# Altium footprint library Footprints.PcbLib: 50 footprints (part 1 of 4)
Each footprint in its own frame and in the unit in brackets; x right, y up, seen from the top. Pads: shape width x height; smd on the part's side, far side on the other; paste and mask are expansions set on the pad; w line width, h text height; cw(c..) or ccw(c..) is an arc to the next point about the centre after c.
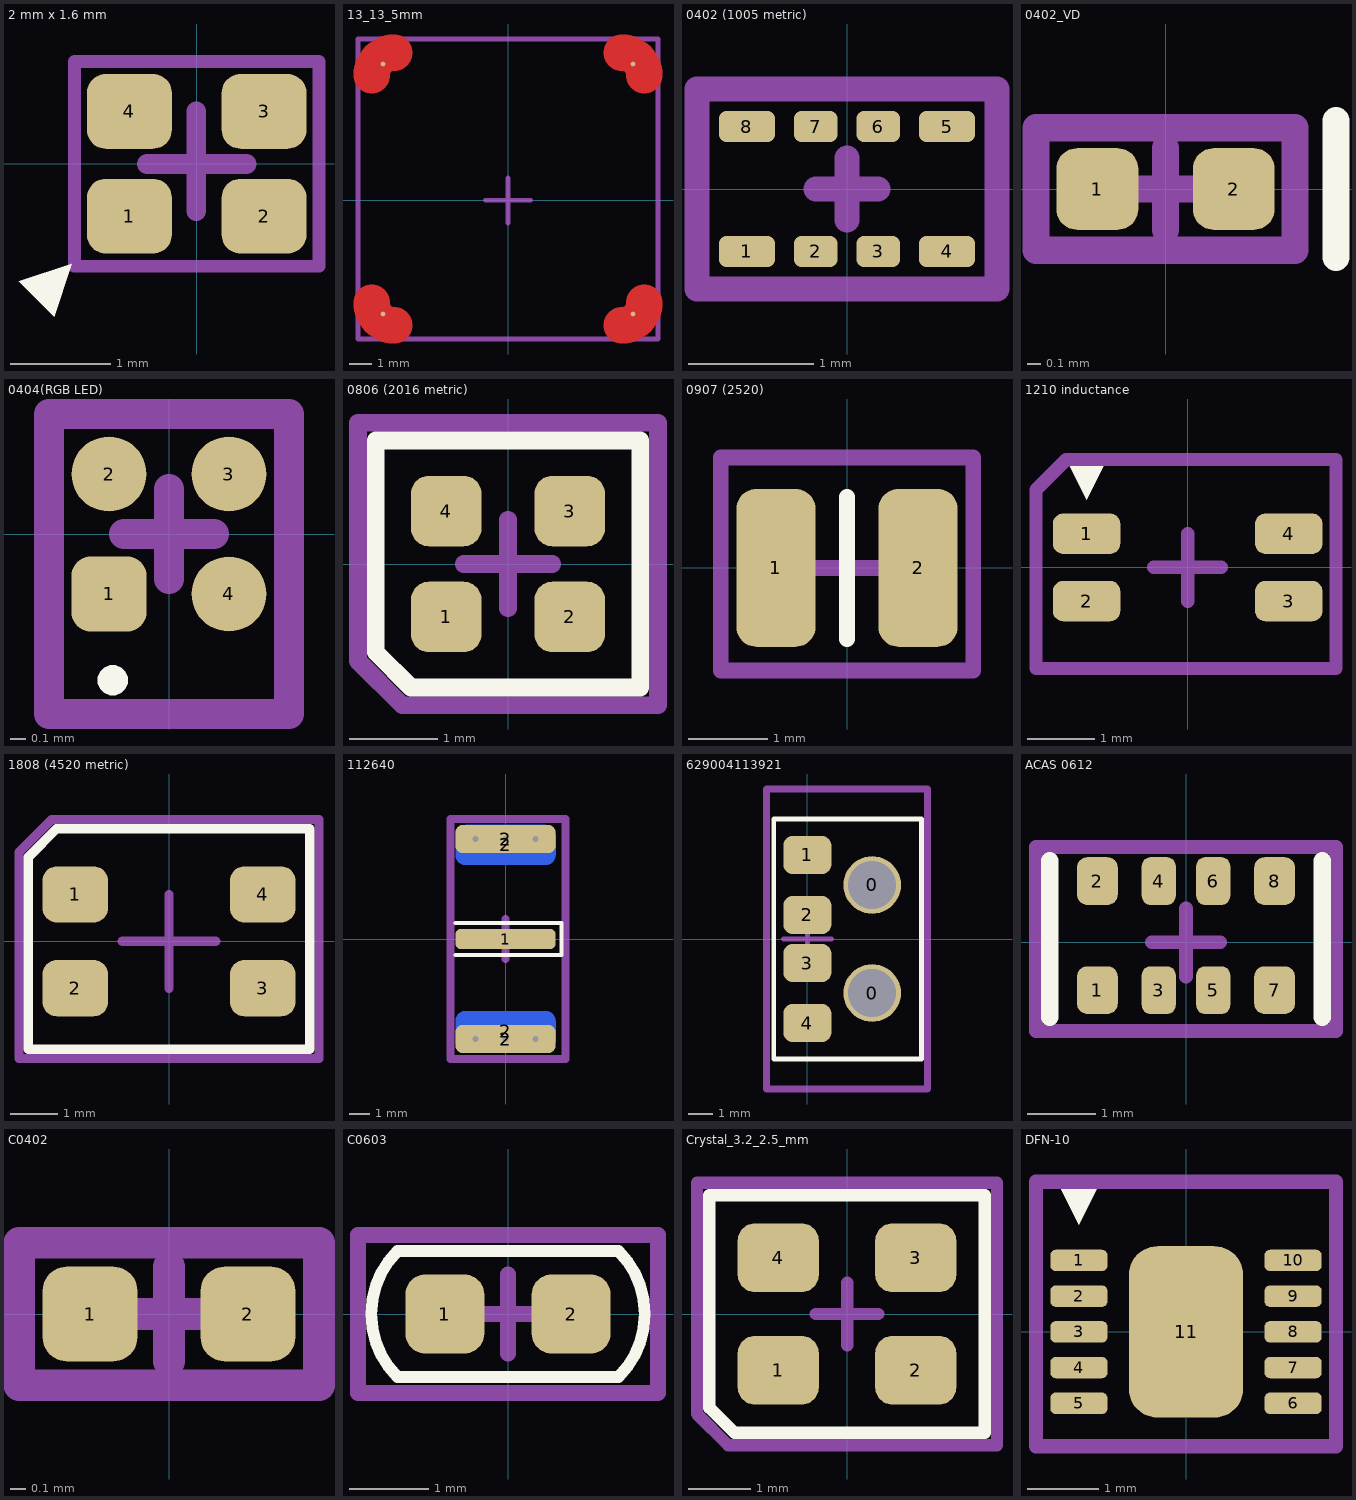
[diagram p0: the footprints below, top view; thin cyan lines are the x and y axes]

## 2 mm x 1.6 mm [mm] "ECS-200-10-37B-CKY-TR"
pads (4):
  rrect50% 0.85x0.75 smd mask+0.051: 1(-0.675,-0.525) 2(0.675,-0.525) 3(0.675,0.525) 4(-0.675,0.525)
Top Overlay:
  region: -1.25,-1 -1.78,-1.177 -1.427,-1.53
Top Assembly:
  lines w0.127: -1.225,-1.025 1.225,-1.025 1.225,1.025 -1.225,1.025 -1.225,-1.025
  lines w0.2: -0.5,0 0.5,0 ; -0.005,-0.475 -0.005,0.525
  text "'.Designator'" at -1.795,1.178 h1
3D body "User Library-NT2016SA-END4910A-48MHZ Crystal (NDK) (1).step": height 0.7, standoff 0, extent -1,-0.8 1,0.8

## 13_13_5mm [mm]
pads (4):
  round 0.2 smd mask+0.051: 1(-5.5,-5) 1(-5.5,6) 1(5.5,-5) 1(5.5,6)
Top Layer:
  lines w1.6: -6,-4.5 ccw(c-5,-4.5) -5,-5.5 ; -6,5.5 cw(c-5,5.5) -5,6.5 ; 5,-5.5 ccw(c5,-4.5) 6,-4.5 ; 5,6.5 cw(c5,5.5) 6,5.5
Top Solder:
  lines w1.6: -6,-4.5 ccw(c-5,-4.5) -5,-5.5 ; -6,5.5 cw(c-5,5.5) -5,6.5 ; 5,-5.5 ccw(c5,-4.5) 6,-4.5 ; 5,6.5 cw(c5,5.5) 6,5.5
Top Assembly:
  lines w0.2: -1,0 1,0 ; 0,-1 0,1 ; -6.6,-6.1 -6.6,7.1 6.6,7.1 6.6,-6.1 -6.6,-6.1
  text "'.Designator'" at -1.795,1.178 h1
3D body "MS130-10S.step": height 5, standoff -1, extent -6.5,-6 6.5,7

## 0402 (1005 metric) [mm] "EXB-28V152JX"
pads (8):
  rrect50% 0.45x0.25 smd mask+0.051: 1(-0.8,-0.5) 4(0.8,-0.5) 5(0.8,0.5) 8(-0.8,0.5)
  rrect50% 0.35x0.25 smd mask+0.051: 2(-0.25,-0.5) 3(0.25,-0.5) 6(0.25,0.5) 7(-0.25,0.5)
Top Assembly:
  lines w0.2: -0.25,0 0.25,0 ; 0,-0.25 0,0.25 ; -1.2,-0.8 1.2,-0.8 1.2,0.8 -1.2,0.8 -1.2,-0.8
  text "'.Designator'" at -1.795,1.178 h1
3D body "User Library-YC124-1.step": height 0.45, standoff 0, extent -1,-0.5 1,0.5

## 0402_VD [mm]
pads (2):
  rrect50% 0.6x0.6 smd mask+0.051: 1(-0.5,0) 2(0.5,0)
Top Overlay:
  lines w0.2: 1.25,-0.5 1.25,0.5
Top Assembly:
  lines w0.2: -0.3,0 0.3,0 ; 0,-0.3 0,0.3 ; -0.95,-0.45 -0.95,0.45 0.95,0.45 0.95,-0.45 -0.95,-0.45
  text "'.Designator'" at -1.795,0.628 h1
3D body "User Library-DIODE_SOD-923.step": height 0.43, standoff 0, extent -0.525,-0.325 0.525,0.325

## 0404(RGB LED) [mm]
pads (4):
  rrect50% 0.5x0.5 smd mask+0.051: 1(-0.4,-0.4)
  round 0.5 smd mask+0.051: 2(-0.4,0.4) 3(0.4,0.4) 4(0.4,-0.4)
Top Overlay:
  region: -0.475,-0.975 -0.475,-0.995 -0.46,-1.032 -0.432,-1.06 -0.395,-1.075 -0.375,-1.075 -0.355,-1.075 -0.318,-1.06 -0.29,-1.032 -0.275,-0.995 -0.275,-0.975 -0.275,-0.955 -0.29,-0.918 -0.318,-0.89 -0.355,-0.875 -0.375,-0.875 -0.395,-0.875 -0.432,-0.89 -0.46,-0.918 -0.475,-0.955
Top Assembly:
  lines w0.2: -0.3,0 0.3,0 ; 0,-0.3 0,0.3 ; -0.8,-1.2 0.8,-1.2 0.8,0.8 -0.8,0.8 -0.8,-1.2
  text "'.Designator'" at -2.4,1.824 h1
3D body "sml-p24muwt86m.stp": height 0.2, standoff 0, extent -0.5,-0.5 0.5,0.5

## 0806 (2016 metric) [mm]
pads (4):
  rrect50% 0.8x0.8 smd mask+0.051: 1(-0.7,-0.6) 2(0.7,-0.6) 3(0.7,0.6) 4(-0.7,0.6)
Top Overlay:
  lines w0.2: -1.5,-1 -1.1,-1.4 1.5,-1.4 1.5,1.4 -1.5,1.4 -1.5,-1
Top Assembly:
  lines w0.2: -0.5,0 0.5,0 ; 0,-0.5 0,0.5 ; -1.7,-1.1 -1.2,-1.6 1.7,-1.6 1.7,1.6 -1.7,1.6 -1.7,-1.1
  text "'.Designator'" at -5.6,2.133 h1
3D body "User Library-NT2016SA-END4910A-48MHZ Crystal (NDK).step": height 0.7, standoff 0, extent -1,-0.8 1,0.8

## 0907 (2520) [mm]
pads (2):
  rrect50% 1x2 smd mask+0.051: 1(-0.9,0) 2(0.9,0)
Top Overlay:
  lines w0.2: 0,-0.9 0,0.9
Top Assembly:
  lines w0.2: -0.5,0 0.5,0 ; 0,-0.5 0,0.5 ; -1.6,-1.3 -1.6,1.4 1.6,1.4 1.6,-1.3 -1.6,-1.3
  text "'.Designator'" at -2.4,1.674 h1
3D body "User Library-Chip Resistor2.step": height 0.63, standoff 0, extent -1.25,-1.25 1.25,1.25

## 1210 inductance [mm]
pads (4):
  rrect50% 1x0.6 smd mask+0.051: 1(-1.5,0.5) 2(-1.5,-0.5) 3(1.5,-0.5) 4(1.5,0.5)
Top Overlay:
  region: -1.5,1 -1.25,1.5 -1.75,1.5
Top Assembly:
  lines w0.2: -0.5,0 0.5,0 ; 0,-0.5 0,0.5 ; -2.25,-1.5 -2.25,1.15 -1.8,1.6 2.2,1.6 2.2,-1.5 -2.25,-1.5
  text "'.Designator'" at -2.4,1.824 h1
3D body "User Library-CM1210B104R-1A.step": height 2.5, standoff 0, extent -1.75,-1.35 1.75,1.35

## 1808 (4520 metric) [mm]
pads (4):
  rrect50% 1.4x1.2 smd mask+0.051: 1(-2,1) 2(-2,-1) 3(2,-1) 4(2,1)
Top Overlay:
  lines w0.2: -3,-2.3 3,-2.3 3,2.4 -2.4,2.4 -3,1.8 -3,-2.3
Top Assembly:
  lines w0.2: -1,0 1,0 ; 0,-1 0,1 ; -3.2,-2.5 3.2,-2.5 3.2,2.6 -2.5,2.6 -3.2,1.9 -3.2,-2.5
  text "'.Designator'" at -2.4,1.574 h1
3D body "acm4520.step": height 1.88, standoff -0.01, extent -2.35,-2.25 2.35,2.25

## 112640 [mm]
pads (5):
  rrect50% 5x1 smd mask+0.051: 1(0,0)
  rrect50% 5x1.4 smd mask+0.051: 2(0,-5) 2(0,5)
  rrect50% 5x2 smd far side mask+0.051: 2(0,-4.6) 2(0,4.7)
via 0,5 diameter 0.6 hole 0.3
via -1.5,5 diameter 0.6 hole 0.3
via 1.5,5 diameter 0.6 hole 0.3
via -1.5,-5 diameter 0.6 hole 0.3
via 1.5,-5 diameter 0.6 hole 0.3
via 0,-5 diameter 0.6 hole 0.3
Top Overlay:
  lines w0.2: -2.5,-0.8 2.8,-0.8 2.8,0.8 -2.5,0.8
Top Assembly:
  lines w0.4: -1,0 1,0 ; 0,-1 0,1 ; -2.75,-6 -2.75,6 3,6 3,-6 -2.75,-6
  text "'.Designator'" at -2.5,1.774 h1
3D body "112640 (1).stp": height 5.9, standoff -5.1, extent -15.485,-5.5 1.485,5.5

## 629004113921 [mm]
pads (6):
  round 2.4 hole 2 mask+0.051: 0(2.7,-2.25) 0(2.7,2.25)
  rrect50% 2x1.6 smd mask+0.051: 1(0,3.5) 2(0,1) 3(0,-1) 4(0,-3.5)
Top Overlay:
  lines w0.2: -1.4,-5 4.75,-5 4.75,5 -1.4,5 -1.4,-5
Top Assembly:
  lines w0.2: -1,0 1,0 ; 0,-1 0,1
  lines w0.3: -1.7,-6.25 -1.7,6.25 5,6.25 5,-6.25 -1.7,-6.25
  text "'.Designator'" at 1.005,-0.022 h1
3D body "Download_STP_629004113921 (rev1).stp": height 2.25, standoff -2.25, extent 0.075,-6 19.875,6

## ACAS 0612 [mm]
pads (8):
  rrect50% 0.6x0.7 smd mask+0.051: 1(-1.3,-0.7) 2(-1.3,0.9) 7(1.3,-0.7) 8(1.3,0.9)
  rrect50% 0.5x0.7 smd mask+0.051: 3(-0.4,-0.7) 4(-0.4,0.9) 5(0.4,-0.7) 6(0.4,0.9)
Top Overlay:
  lines w0.254: -2,-1.1 -2,1.2 ; 2,-1.1 2,1.2
Top Assembly:
  lines w0.2: -0.5,0 0.5,0 ; 0,-0.5 0,0.5 ; -2.2,-1.3 -2.2,1.4 2.2,1.4 2.2,-1.3 -2.2,-1.3
  text "'.Designator'" at -1.795,1.578 h1
3D body "ACAS 0612.stp": height 0.45, standoff 0, extent -1.6,-0.5 1.6,1

## C0402 [mm]
height 0.6
pads (2):
  rrect50% 0.6x0.6 smd mask+0.051: 1(-0.5,0) 2(0.5,0)
Top Assembly:
  lines w0.2: -0.3,0 0.3,0 ; 0,-0.3 0,0.3 ; -0.95,-0.45 -0.95,0.45 0.95,0.45 0.95,-0.45 -0.95,-0.45
  text "'.Designator'" at -1.795,0.628 h1
3D body "User Library-Chip Cap_MLCC_0402 (1005).step": height 0.5, standoff 0, extent -0.5,-0.25 0.5,0.25

## C0603 [mm]
height 0.6
pads (2):
  rrect50% 1x1 smd mask+0.051: 1(-0.8,0) 2(0.8,0)
Top Overlay:
  lines w0.15: -1.4,-0.8 cw(c-0.6,0) -1.4,0.8 1.4,0.8 cw(c0.6,0) 1.4,-0.8 -1.4,-0.8
Top Assembly:
  lines w0.2: -0.5,0 0.5,0 ; 0,-0.5 0,0.5 ; -1.9,-1 1.9,-1 1.9,1 -1.9,1 -1.9,-1
  text "'.Designator'" at -1.645,1.178 h1
3D body "User Library-cap0603.STEP": height 0.86, standoff -0.04, extent -1.3,-0.5 1.3,0.5

## Crystal_3.2_2.5_mm [mm] "for ECS-160-12-33Q-JES-TR"
pads (4):
  rrect50% 1.3x1.1 smd mask+0.051: 1(-1.1,-0.9) 2(1.1,-0.9) 3(1.1,0.9) 4(-1.1,0.9)
Top Overlay:
  lines w0.2: -2.2,-1.5 -2.2,1.9 2.2,1.9 2.2,-1.9 -1.8,-1.9 -2.2,-1.5
Top Assembly:
  lines w0.2: -0.5,0 0.5,0 ; 0,-0.5 0,0.5 ; -2.4,-1.6 -2.4,2.1 2.4,2.1 2.4,-2.1 -1.9,-2.1 -2.4,-1.6
  text "'.Designator'" at -5.8,2.533 h1
3D body "User Library-Crystal_ECX-32.STEP": height 0.82, standoff 0, extent -1.6,-1.25 1.6,1.25

## DFN-10 [mm]
pads (11):
  rrect50% 0.8x0.3 smd mask+0.051: 1(-1.5,1) 2(-1.5,0.5) 3(-1.5,0) 4(-1.5,-0.5) 5(-1.5,-1) 6(1.5,-1) 7(1.5,-0.5) 8(1.5,0) 9(1.5,0.5) 10(1.5,1)
  rrect50% 1.6x2.4 smd mask+0.051: 11(0,0)
Top Overlay:
  region: -1.5,1.5 -1.25,2 -1.75,2
Top Assembly:
  lines w0.2: -0.5,0 0.5,0 ; 0,-0.5 0,0.5 ; -2.1,-1.6 -2.1,2.1 2.1,2.1 2.1,-1.6 -2.1,-1.6
  text "'.Designator'" at -5.8,2.533 h1
3D body "User Library-DFN-10.STEP": height 0.8, standoff 0, extent -1.5,-1.5 1.5,1.5